# Altium schematic symbol library IC_ADI.SCHLIB: 3169 symbols (part 3 of 181) (continued)
## AD745KR-16
designator U?
Single Channel Ultralow Noise Performance Operational Amplifier, 20 MHz BW, 12.5 V/us SR, Commercial, 16-pin SOIC (RW-16), Tube; Generic Part Number: AD745; PartNumber: AD745KR-16; Amplifiers Per Package: 1; Input Bias Current: 150pA; Input Offset Voltage: 100uV; Iq/Amp: 10mA; Small Signal Bandwidth: 20MHz; V Span Max: 36V; V Span Min: 9.6V; DatasheetVersion: Rev. D; PackageVersion: 032707-B; PackageReference: RW-16; PackageDescription: 16-Pin Standard Small Outline Package, Body 10.3 x 7.5 mm, Pitch 1.27 mm; Supplier Part Number 1: AD745KR-16-ND; Packing: Tube; Slew Rate: 12.5V/us; Mounting Technology: Surface Mount; Code_JEDEC: MS-013-AA; ComponentLink1Description: Manufacturer URL; ComponentLink2Description: Datasheet; ComponentLink3Description: Package Specification
footprint SOIC16W_1.27 (Footprint not found)
part A pins: 2 OFFSET NULL (in), 3 -IN (in), 5 +IN (in), 6 -VS (power), 11 OFFSET NULL (in), 12 OUT (out), 13 +VS (power)
part B pins: 1 NC, 4 NC, 7 NC, 8 NC, 9 NC, 10 NC, 14 NC, 15 NC, 16 NC

## AD746AQ
designator U?
Double Channel Operational Amplifier, 13 MHz BW, 75 V/us SR, Industrial, 8-pin DIP (Q-8), Tube; Generic Part Number: AD746; PartNumber: AD746AQ; Amplifiers Per Package: 2; Input Bias Current: 110pA; Input Offset Voltage: 300uV; Iq/Amp: 4mA; Slew Rate: 75V/us; Small Signal Bandwidth: 13MHz; V Span Max: 36V; V Span Min: 9.6V; DatasheetVersion: Rev. B; PackageReference: Q-8; PackageDescription: 8-Pin Ceramic Dual In-Line Package, Row spacing 7.62 mm, Pitch 2.54 mm; Supplier Part Number 1: AD746AQ-ND; Supplier Part Number 2: 66F4829; Packing: Tube; Mounting Technology: Through Hole; ComponentLink1Description: Manufacturer URL; ComponentLink2Description: Datasheet; ComponentLink3Description: Package Specification
footprint DIP8 (Footprint not found)
pins on every part: 4 -V (power), 8 +V (power)
part A pins: 1 OUT (out), 2 -IN (in), 3 +IN (in)
part B pins: 5 +IN (in), 6 -IN (in), 7 OUT (out)

## AD746BQ
designator U?
Double Channel Operational Amplifier, 13 MHz BW, 75 V/us SR, Industrial, 8-pin DIP (Q-8), Tube; Generic Part Number: AD746; PartNumber: AD746BQ; Amplifiers Per Package: 2; Input Bias Current: 110pA; Input Offset Voltage: 300uV; Iq/Amp: 4mA; Slew Rate: 75V/us; Small Signal Bandwidth: 13MHz; V Span Max: 36V; V Span Min: 9.6V; DatasheetVersion: Rev. B; PackageReference: Q-8; PackageDescription: 8-Pin Ceramic Dual In-Line Package, Row spacing 7.62 mm, Pitch 2.54 mm; Supplier Part Number 1: AD746BQ-ND; Packing: Tube; Mounting Technology: Through Hole; ComponentLink1Description: Manufacturer URL; ComponentLink2Description: Datasheet; ComponentLink3Description: Package Specification
footprint DIP8 (Footprint not found)
pins on every part: 4 -V (power), 8 +V (power)
part A pins: 1 OUT (out), 2 -IN (in), 3 +IN (in)
part B pins: 5 +IN (in), 6 -IN (in), 7 OUT (out)

## AD746JN
designator U?
Double Channel Operational Amplifier, 13 MHz BW, 75 V/us SR, Commercial, 8-pin DIP (N-8), Tube; Generic Part Number: AD746; PartNumber: AD746JN; Amplifiers Per Package: 2; Input Bias Current: 110pA; Input Offset Voltage: 300uV; Iq/Amp: 4mA; Slew Rate: 75V/us; Small Signal Bandwidth: 13MHz; V Span Max: 36V; V Span Min: 9.6V; DatasheetVersion: Rev. B; PackageVersion: 070606-A; PackageReference: N-8; PackageDescription: 8-Pin Plastic Dual In-Line Package, Row spacing 7.62 mm, Pitch 2.54 mm; Supplier Part Number 1: AD746JN-ND; Packing: Tube; Mounting Technology: Through Hole; Code_JEDEC: MS-001; ComponentLink1Description: Manufacturer URL; ComponentLink2Description: Datasheet; ComponentLink3Description: Package Specification
footprint DIP8 (Footprint not found)
pins on every part: 4 -V (power), 8 +V (power)
part A pins: 1 OUT (out), 2 -IN (in), 3 +IN (in)
part B pins: 5 +IN (in), 6 -IN (in), 7 OUT (out)

## AD746SQ
designator U?
Double Channel Operational Amplifier, 13 MHz BW, 75 V/us SR, Military, 8-pin DIP (Q-8), Tube; Generic Part Number: AD746; PartNumber: AD746SQ; Amplifiers Per Package: 2; Input Bias Current: 110pA; Input Offset Voltage: 300uV; Iq/Amp: 4mA; Slew Rate: 75V/us; Small Signal Bandwidth: 13MHz; V Span Max: 36V; V Span Min: 9.6V; DatasheetVersion: Rev. B; PackageReference: Q-8; PackageDescription: 8-Pin Ceramic Dual In-Line Package, Row spacing 7.62 mm, Pitch 2.54 mm; Supplier Part Number 1: AD746SQ-ND; Supplier Part Number 2: 66F4831; Packing: Tube; Mounting Technology: Through Hole; ComponentLink1Description: Manufacturer URL; ComponentLink2Description: Datasheet; ComponentLink3Description: Package Specification
footprint DIP8 (Footprint not found)
pins on every part: 4 -V (power), 8 +V (power)
part A pins: 1 OUT (out), 2 -IN (in), 3 +IN (in)
part B pins: 5 +IN (in), 6 -IN (in), 7 OUT (out)

## AD746SQ/883B
designator U?
Double Channel Operational Amplifier, 13 MHz BW, 75 V/us SR, Military, 8-pin DIP (Q-8), Tube; Generic Part Number: AD746; PartNumber: AD746SQ/883B; Amplifiers Per Package: 2; Input Bias Current: 110pA; Input Offset Voltage: 300uV; Iq/Amp: 4mA; Slew Rate: 75V/us; Small Signal Bandwidth: 13MHz; V Span Max: 36V; V Span Min: 9.6V; DatasheetVersion: Rev. B; PackageReference: Q-8; PackageDescription: 8-Pin Ceramic Dual In-Line Package, Row spacing 7.62 mm, Pitch 2.54 mm; Supplier Part Number 1: AD746SQ/883B-ND; Packing: Tube; Mounting Technology: Through Hole; ComponentLink1Description: Manufacturer URL; ComponentLink2Description: Datasheet; ComponentLink3Description: Package Specification
footprint DIP8 (Footprint not found)
pins on every part: 4 -V (power), 8 +V (power)
part A pins: 1 OUT (out), 2 -IN (in), 3 +IN (in)
part B pins: 5 +IN (in), 6 -IN (in), 7 OUT (out)

## AD760AQ
designator U?
Single 18-Bit Self-Calibrating DACPORT, -40 to +85 degC, Q-28-2, Tube; Generic Part Number: AD760; PartNumber: AD760AQ; # DAC Outputs: 1; Max V+: 15.75V; Op Pwr Diss: 725mW; Resolution (Bits): 18; Settling Time: 6祍; Single Supply: No; DatasheetVersion: Rev.A; PackageVersion: 030106-A; PackageReference: Q-28-2; PackageDescription: 28-Lead Ceramic Dual In-Line Package [CERDIP]; Supplier Part Number 1: AD760AQ-ND; Supplier Part Number 2: 91F2883; Supplier Part Number 3: 584-AD760AQ; Packing: Tube; RoHS: N; Mounting Technology: Through Hole; ComponentLink1Description: Manufacturer URL; ComponentLink2Description: Datasheet; ComponentLink3Description: Package Specification; ComponentLink4Description: Product URL
footprint DIP28W (Footprint not found)
pins: 1 CALOK (out), 2 ~{CAL} (in), 3 -VEE (power), 4 +VCC (power), 5 +VLL (power), 6 DGND (power), 7 DB7|15 (in), 8 DB6|14 (in), 9 DB5|13 (in), 10 DB4|12 (in), 11 DB3|11 (in), 12 DB2|10|18/~{16} SERIAL (in), 13 DB1|9| MSB/~{LSB} (in), 14 DB0|8| SIN (in), 15 SOUT (out), 16 ~{CS} (in), 17 ~{LBE}| ~{UNI}/BIP CLR (in), 18 ~{HBE} (in), 19 ~{SER} (in), 20 ~{CLR} (in), 21 LDAC (in), 22 AGND (power), 23 VOUT (out), 24 SPAN/BIP OFF (in), 25 REF IN (in), 26 REF OUT (out), 27 MUXOUT (out), 28 MUXIN (in)

## AD766AN
designator U?
Single 16-Bit DSP DACPORT, -40 to +85 degC, N-16, Tube; Generic Part Number: AD766; PartNumber: AD766AN; # DAC Outputs: 1; Max V+: 13.2V; Op Pwr Diss: 150mW; Resolution (Bits): 16; Settling Time: 1.5祍; Single Supply: No; DatasheetVersion: Rev.A; PackageVersion: 070706-A; PackageReference: N-16; PackageDescription: 16-Lead Plastic Dual In-Line Package [PDIP] Narrow Body; Supplier Part Number 1: AD766AN-ND; Supplier Part Number 2: 92F8946; Supplier Part Number 3: 584-AD766AN; Packing: Tube; RoHS: N; Mounting Technology: Through Hole; Code_JEDEC: MS-001; ComponentLink1Description: Manufacturer URL; ComponentLink2Description: Datasheet; ComponentLink3Description: Package Specification; ComponentLink4Description: Product URL
footprint DIP16 (Footprint not found)
pins: 1 -VS (power) "Analog Negative Power Supply", 2 DGND (power) "Digital Ground", 3 VL (power) "Logic Positive Power Supply", 4 NC "No Connection", 5 ~{CLK} (in) "Clock Input", 6 LE (in) "Latch Enable Input", 7 DATA (in) "Serial Data Input", 8 -VL (power) "Logic Negative Power Supply", 9 VOUT (out) "Voltage Output", 10 RF (in) "Feedback Resistor", 11 SJ (in) "Summing Junction", 12 AGND (power) "Analog Ground", 13 IOUT (out) "Current Output", 14 MSB ADJ (in) "MSB Adjustment Terminal", 15 TRIM "MSB Trimming Potentiometer Terminal", 16 VS (power) "Analog Positive Power Supply"

## AD766SD/883B
designator U?
Single 16-Bit DSP DACPORT, -55 to +125 degC, D-16, Tube; Generic Part Number: AD766; PartNumber: AD766SD/883B; # DAC Outputs: 1; Max V+: 13.2V; Op Pwr Diss: 150mW; Resolution (Bits): 16; Settling Time: 1.5祍; Single Supply: No; DatasheetVersion: Rev.A; PackageVersion: Oct-2004; PackageReference: D-16; PackageDescription: 16-Lead Side-Brazed Ceramic Dual In-Line Package [SBDIP]; Supplier Part Number 1: 584-AD766SD883B; Packing: Tube; RoHS: N; Mounting Technology: Through Hole; ComponentLink1Description: Manufacturer URL; ComponentLink2Description: Datasheet; ComponentLink3Description: Package Specification; ComponentLink4Description: Product URL
footprint DIP16 (Footprint not found)
pins: 1 -VS (power) "Analog Negative Power Supply", 2 DGND (power) "Digital Ground", 3 VL (power) "Logic Positive Power Supply", 4 NC "No Connection", 5 ~{CLK} (in) "Clock Input", 6 LE (in) "Latch Enable Input", 7 DATA (in) "Serial Data Input", 8 -VL (power) "Logic Negative Power Supply", 9 VOUT (out) "Voltage Output", 10 RF (in) "Feedback Resistor", 11 SJ (in) "Summing Junction", 12 AGND (power) "Analog Ground", 13 IOUT (out) "Current Output", 14 MSB ADJ (in) "MSB Adjustment Terminal", 15 TRIM "MSB Trimming Potentiometer Terminal", 16 VS (power) "Analog Positive Power Supply"

## AD768AR
designator U?
Single 16-Bit Digital-to-Analog Converter, -40 to +85 degC, RW-28, Tube; Generic Part Number: AD768; PartNumber: AD768AR; # DAC Outputs: 1; Max V+: 5.25V; Op Pwr Diss: 600mW; Resolution (Bits): 16; Settling Time: 25ns; Single Supply: No; DatasheetVersion: Rev.B; PackageVersion: 060706-A; PackageReference: RW-28; PackageDescription: 28-Lead Standard Small Outline Package [SOIC_W]; Supplier Part Number 1: AD768AR-ND; Supplier Part Number 2: 584-AD768AR; Packing: Tube; RoHS: N; Mounting Technology: Surface Mount; Code_JEDEC: MS-013-AE; ComponentLink1Description: Manufacturer URL; ComponentLink2Description: Datasheet; ComponentLink3Description: Product URL
footprint SOIC28W_1.27 (Footprint not found)
pins: 1 IOUTA (out) "DAC Current Output. Full-scale current when all data bits are 1s.", 2 NR "Noise Reduction Node. Add capacitor for noise reduction.", 3 REFOUT (out) "Reference Output Voltage. Nominal value is 2.5 V.", 4 NC "No Connect. Reserved for internal use.", 5 REFCOM (power) "Reference Ground.", 6 IREFIN (in) "Reference Input Current. Nominal is 5 mA. DAC full-scale is 4x this current.", 7 DB0 (in) "Data Bit 0 (LSB).", 8 DB1 (in) "Data Bit 1", 9 DB2 (in) "Data Bit 2", 10 DB3 (in) "Data Bit 3", 11 DB4 (in) "Data Bit 4", 12 DB5 (in) "Data Bit 5", 13 DB6 (in) "Data Bit 6", 14 DB7 (in) "Data Bit 7", 15 DCOM (power) "Digital Ground.", 16 CLOCK (in) "Clock Input. Data latched on positive edge of clock.", 17 DB8 (in) "Data Bit 8", 18 DB9 (in) "Data Bit 9", 19 DB10 (in) "Data Bit 10", 20 DB11 (in) "Data Bit 11", 21 DB12 (in) "Data Bit 12", 22 DB13 (in) "Data Bit 13", 23 DB14 (in) "Data Bit 14", 24 DB15 (in) "Data Bit 15 (MSB).", 25 VDD (power) "Positive Supply Voltage. Nominal is +5 V.", 26 VEE (power) "Negative Supply Voltage. Nominal is -5 V.", 27 IOUTB "Complementary DAC Current Output. Full-scale current when all data bits are 0s.", 28 LADCOM (power) "DAC Ladder Common."

## AD780AN
designator U?
High Precision Reference, 2.5 or 3 V Output, 4 to 36 V Supply, Industrial, 8-pin DIP (N-8), Tube; PartNumber: AD780AN; Max V Supply (V): 36; Min V Supply (V): 4; Ref Out TC (ppm/C): 7; Vout: 2.5V, 3V; DatasheetVersion: Rev. F; PackageVersion: 070606-A, 07/2006; PackageReference: N-8; PackageDescription: 8-Pin Plastic Dual In-Line Package, Row spacing 7.62 mm, Pitch 2.54 mm; Supplier Part Number 1: AD780AN-ND; Supplier Part Number 2: N/A; Packing: Tube; Operating Temp Range: -40 to 85 degC; Mounting Technology: Through Hole; Code_JEDEC: MS-001; ComponentLink1Description: Manufacturer URL; ComponentLink2Description: Datasheet; ComponentLink3Description: Package Specification; ComponentLink4Description: URL Link1
footprint DIP8 (Footprint not found)
pins: 1 NC, 2 +VIN (power), 3 TEMP (out), 4 GND (power), 5 TRIM (in), 6 VOUT (power), 7 NC, 8 2.5V/3.0V O/P SELECT (in)

## AD780AR
designator U?
High Precision Reference, 2.5 or 3 V Output, 4 to 36 V Supply, Industrial, 8-pin SOIC (R-8), Tube; PartNumber: AD780AR; Max V Supply (V): 36; Min V Supply (V): 4; Ref Out TC (ppm/C): 7; Vout: 2.5V, 3V; DatasheetVersion: Rev. F; PackageVersion: 060506-A, 06/2006; PackageReference: R-8; PackageDescription: 8-Pin Standard Small Outline Package, Body 4.9 x 3.9 mm, Pitch 1.27 mm; Supplier Part Number 1: AD780AR-ND; Supplier Part Number 2: 584-AD780AR; Packing: Tube; Operating Temp Range: -40 to 85 degC; Mounting Technology: Surface Mount; Code_JEDEC: MS-012-AA; ComponentLink1Description: Manufacturer URL; ComponentLink2Description: Datasheet; ComponentLink3Description: Package Specification; ComponentLink4Description: URL Link1
footprint SOIC8_1.27 (Footprint not found)
pins: 1 NC, 2 +VIN (power), 3 TEMP (out), 4 GND (power), 5 TRIM (in), 6 VOUT (power), 7 NC, 8 2.5V/3.0V O/P SELECT (in)

## AD780BN
designator U?
High Precision Reference, 2.5 or 3 V Output, 4 to 36 V Supply, Industrial, 8-pin DIP (N-8), Tube; PartNumber: AD780BN; Max V Supply (V): 36; Min V Supply (V): 4; Ref Out TC (ppm/C): 3; Vout: 2.5V, 3V; DatasheetVersion: Rev. F; PackageVersion: 070606-A, 07/2006; PackageReference: N-8; PackageDescription: 8-Pin Plastic Dual In-Line Package, Row spacing 7.62 mm, Pitch 2.54 mm; Supplier Part Number 1: AD780BN-ND; Supplier Part Number 2: N/A; Packing: Tube; Operating Temp Range: -40 to 85 degC; Mounting Technology: Through Hole; Code_JEDEC: MS-001; ComponentLink1Description: Manufacturer URL; ComponentLink2Description: Datasheet; ComponentLink3Description: Package Specification; ComponentLink4Description: URL Link1
footprint DIP8 (Footprint not found)
pins: 1 NC, 2 +VIN (power), 3 TEMP (out), 4 GND (power), 5 TRIM (in), 6 VOUT (power), 7 NC, 8 2.5V/3.0V O/P SELECT (in)

## AD780BR
designator U?
High Precision Reference, 2.5 or 3 V Output, 4 to 36 V Supply, Industrial, 8-pin SOIC (R-8), Tube; PartNumber: AD780BR; Max V Supply (V): 36; Min V Supply (V): 4; Ref Out TC (ppm/C): 3; Vout: 2.5V, 3V; DatasheetVersion: Rev. F; PackageVersion: 060506-A, 06/2006; PackageReference: R-8; PackageDescription: 8-Pin Standard Small Outline Package, Body 4.9 x 3.9 mm, Pitch 1.27 mm; Supplier Part Number 1: AD780BR-ND; Supplier Part Number 2: 584-AD780BR; Packing: Tube; Operating Temp Range: -40 to 85 degC; Mounting Technology: Surface Mount; Code_JEDEC: MS-012-AA; ComponentLink1Description: Manufacturer URL; ComponentLink2Description: Datasheet; ComponentLink3Description: Package Specification; ComponentLink4Description: URL Link1
footprint SOIC8_1.27 (Footprint not found)
pins: 1 NC, 2 +VIN (power), 3 TEMP (out), 4 GND (power), 5 TRIM (in), 6 VOUT (power), 7 NC, 8 2.5V/3.0V O/P SELECT (in)

## AD790AQ
designator U?
Fast, Precision Comparator, + / - 15 V, 45 ns Delay, Industrial, 8-pin DIP (Q-8), Tube; PartNumber: AD790AQ; Input Range (V): -VS to VS-2; Total Power (mW): 250mW; Voltage Supply (V): +/-15, 5; DatasheetVersion: Rev. D; PackageVersion: Aug-05; PackageReference: Q-8; PackageDescription: 8-Pin Ceramic Dual In-Line Package, Row spacing 7.62 mm, Pitch 2.54 mm; Supplier Part Number 1: AD790AQ-ND; Supplier Part Number 2: 584-AD790AQ; Packing: Tube; Mounting Technology: Through Hole; ComponentLink1Description: Manufacturer URL; ComponentLink2Description: Datasheet; ComponentLink3Description: Package Specification; ComponentLink4Description: URL Link1; ComponentLink5Description: URL Link2
footprint DIP8 (Footprint not found)
pins: 1 +VS (power), 2 +IN (in), 3 -IN (in), 4 -VS (power), 5 ~{LATCH} (in), 6 GROUND (power), 7 OUTPUT (out), 8 VLOGIC (power)

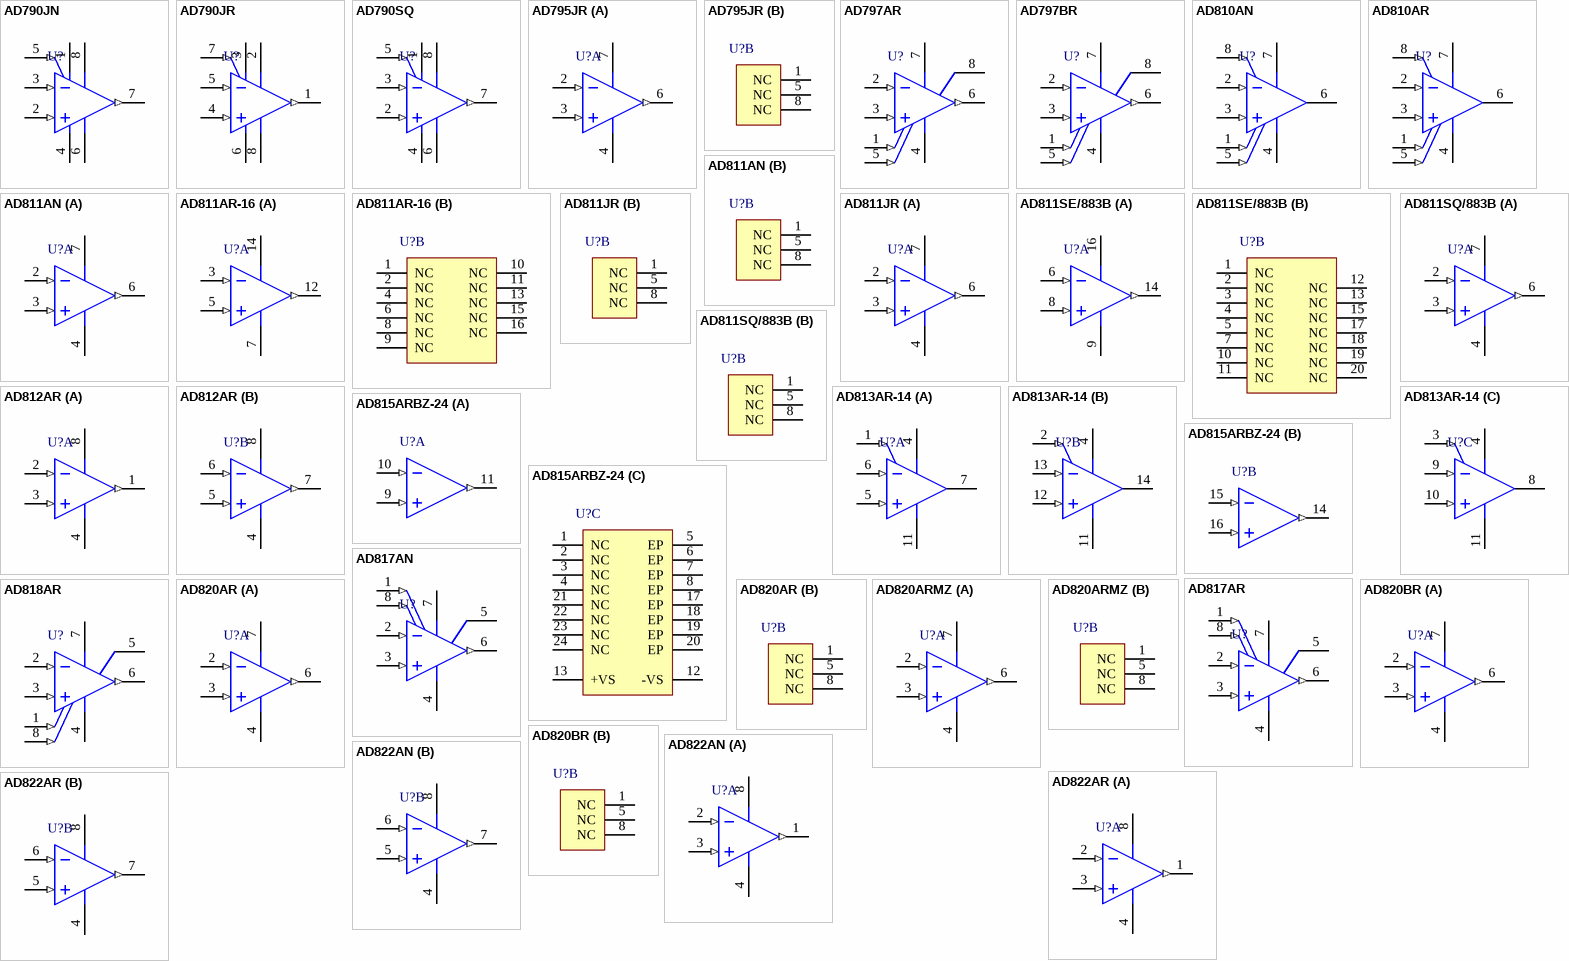
[diagram p6: symbols AD790JN to AD822AR]

## AD790JN
designator U?
Fast, Precision Comparator, + / - 15 V, 45 ns Delay, Commercial, 8-pin DIP (N-8), Tube; PartNumber: AD790JN; Input Range (V): -VS to VS-2; Total Power (mW): 250mW; Voltage Supply (V): +/-15, 5; DatasheetVersion: Rev. D; PackageVersion: 070606-A, 07/2006; PackageReference: N-8; PackageDescription: 8-Pin Plastic Dual In-Line Package, Row spacing 7.62 mm, Pitch 2.54 mm; Supplier Part Number 1: AD790JN-ND; Supplier Part Number 2: 584-AD790JN; Packing: Tube; Mounting Technology: Through Hole; Code_JEDEC: MS-001; ComponentLink1Description: Manufacturer URL; ComponentLink2Description: Datasheet; ComponentLink3Description: Package Specification; ComponentLink4Description: URL Link1; ComponentLink5Description: URL Link2
footprint DIP8 (Footprint not found)
pins: 1 +VS (power), 2 +IN (in), 3 -IN (in), 4 -VS (power), 5 ~{LATCH} (in), 6 GROUND (power), 7 OUTPUT (out), 8 VLOGIC (power)

## AD790JR
designator U?
Fast, Precision Comparator, + / - 15 V, 45 ns Delay, Commercial, 8-pin SOIC (R-8), Tube; PartNumber: AD790JR; Input Range (V): -VS to VS-2; Total Power (mW): 250mW; Voltage Supply (V): +/-15, 5; DatasheetVersion: Rev. D; PackageVersion: 060506-A, 06/2006; PackageReference: R-8; PackageDescription: 8-Pin Standard Small Outline Package, Body 4.9 x 3.9 mm, Pitch 1.27 mm; Supplier Part Number 1: AD790JR-ND; Supplier Part Number 2: 584-AD790JR; Packing: Tube; Mounting Technology: Surface Mount; Code_JEDEC: MS-012-AA; ComponentLink1Description: Manufacturer URL; ComponentLink2Description: Datasheet; ComponentLink3Description: Package Specification; ComponentLink4Description: URL Link1; ComponentLink5Description: URL Link2
footprint SOIC8_1.27 (Footprint not found)
pins: 1 OUTPUT (out), 2 VLOGIC (power), 3 +VS (power), 4 +IN (in), 5 -IN (in), 6 -VS (power), 7 ~{LATCH} (in), 8 GROUND (power)

## AD790SQ
designator U?
Fast, Precision Comparator, + / - 15 V, 45 ns Delay, Military, 8-pin DIP (Q-8), Tube; PartNumber: AD790SQ; Input Range (V): -VS to VS-2; Total Power (mW): 250mW; Voltage Supply (V): +/-15, 5; DatasheetVersion: Rev. D; PackageVersion: Aug-05; PackageReference: Q-8; PackageDescription: 8-Pin Ceramic Dual In-Line Package, Row spacing 7.62 mm, Pitch 2.54 mm; Supplier Part Number 1: AD790SQ-ND; Supplier Part Number 2: 584-AD790SQ; Packing: Tube; Mounting Technology: Through Hole; ComponentLink1Description: Manufacturer URL; ComponentLink2Description: Datasheet; ComponentLink3Description: Package Specification; ComponentLink4Description: URL Link1; ComponentLink5Description: URL Link2
footprint DIP8 (Footprint not found)
pins: 1 +VS (power), 2 +IN (in), 3 -IN (in), 4 -VS (power), 5 ~{LATCH} (in), 6 GROUND (power), 7 OUTPUT (out), 8 VLOGIC (power)

## AD795JR
designator U?
Single Channel Low Power Replacement for Burr-Brown Operational Amplifier, 16 KHz BW, 1 V/祍 SR, Commercial, 8-pin SOIC (R-8), Tube; Generic Part Number: AD795; PartNumber: AD795JR; Amplifiers Per Package: 1; Input Bias Current: 1pA; Input Offset Voltage: 100uV; Iq/Amp: 1.5mA; Slew Rate: 1V/us; Small Signal Bandwidth: 1.6MHz; V Span Max: 36V; V Span Min: 8V; DatasheetVersion: Rev. C; PackageVersion: 060506-A; PackageReference: R-8; PackageDescription: 8-Pin Standard Small Outline Package, Body 3.9 x 4.9 mm, Pitch 1.27 mm; Supplier Part Number 1: AD795JR-ND; Mounting Technology: Surface Mount; Code_JEDEC: MS-012-AA; ComponentLink1Description: Manufacturer URL; ComponentLink2Description: Datasheet; ComponentLink3Description: Package Specification
footprint SOIC8_1.27 (Footprint not found)
part A pins: 2 -IN (in), 3 +IN (in), 4 -VS (power), 6 OUT (out), 7 +VS (power)
part B pins: 1 NC, 5 NC, 8 NC

## AD797AR
designator U?
Single Channel Low Noise Operational Amplifier, 8 MHz BW, 20 V/us SR, Industrial, 8-pin SOIC (R-8), Tube; Generic Part Number: AD797; PartNumber: AD797AR; Amplifiers Per Package: 1; Input Bias Current: 250nA; Input Offset Voltage: 25uV; Iq/Amp: 10.5mA; Slew Rate: 20V/us; Small Signal Bandwidth: 8MHz; V Span Max: 36V; V Span Min: 10V; DatasheetVersion: Rev. H; PackageVersion: 060506-A; PackageReference: R-8; PackageDescription: 8-Pin Standard Small Outline Package, Body 3.9 x 4.9 mm, Pitch 1.27 mm; Supplier Part Number 1: AD797AR-ND; Mounting Technology: Surface Mount; Code_JEDEC: MS-012-AA; ComponentLink1Description: Manufacturer URL; ComponentLink2Description: Datasheet; ComponentLink3Description: Package Specification
footprint SOIC8_1.27 (Footprint not found)
pins: 1 OFFSET NULL (in), 2 -IN (in), 3 +IN (in), 4 -VS (power), 5 OFFSET NULL (in), 6 OUT (out), 7 +VS (power), 8 DECOMPENSATION AND DISTORTION NEUTRALIZATION

## AD797BR
designator U?
Single Channel Low Noise Operational Amplifier, 8 MHz BW, 20 V/us SR, Industrial, 8-pin SOIC (R-8), Tube; Generic Part Number: AD797; PartNumber: AD797BR; Amplifiers Per Package: 1; Input Bias Current: 250nA; Input Offset Voltage: 25uV; Iq/Amp: 10.5mA; Slew Rate: 20V/us; Small Signal Bandwidth: 8MHz; V Span Max: 36V; V Span Min: 10V; DatasheetVersion: Rev. H; PackageVersion: 060506-A; PackageReference: R-8; PackageDescription: 8-Pin Standard Small Outline Package, Body 3.9 x 4.9 mm, Pitch 1.27 mm; Supplier Part Number 1: AD797BR-ND; Mounting Technology: Surface Mount; Code_JEDEC: MS-012-AA; ComponentLink1Description: Manufacturer URL; ComponentLink2Description: Datasheet; ComponentLink3Description: Package Specification
footprint SOIC8_1.27 (Footprint not found)
pins: 1 OFFSET NULL (in), 2 -IN (in), 3 +IN (in), 4 -VS (power), 5 OFFSET NULL (in), 6 OUT (out), 7 +VS (power), 8 DECOMPENSATION AND DISTORTION NEUTRALIZATION

## AD810AN
designator U?
Single Channel Low Power Operational Amplifier, 80 MHz BW, 1 KV/us SR, Industrial, 8-pin DIP (N-8), Tube; Generic Part Number: AD810; PartNumber: AD810AN; Amplifiers Per Package: 1; Input Bias Current: 2uA; Input Offset Voltage: 1.5mV; Iq/Amp: 8mA; Slew Rate: 1KV/us; Small Signal Bandwidth: 80MHz; V Span Max: 36V; V Span Min: 5V; DatasheetVersion: Rev. A; PackageVersion: 070606-A; PackageReference: N-8; PackageDescription: 8-Pin Plastic Dual In-Line Package, Row spacing 7.62 mm, Pitch 2.54 mm; Supplier Part Number 1: AD810AN-ND; Mounting Technology: Through Hole; Code_JEDEC: MS-001; ComponentLink1Description: Manufacturer URL; ComponentLink2Description: Datasheet; ComponentLink3Description: Package Specification
footprint DIP8 (Footprint not found)
pins: 1 OFFSET NULL (in), 2 -IN (in), 3 +IN (in), 4 -VS (power), 5 OFFSET NULL (in), 6 OUT (hiz), 7 +VS (power), 8 ~{DISABLE} (in)

## AD810AR
designator U?
Single Channel Low Power Operational Amplifier, 80 MHz BW, 1 KV/us SR, Industrial, 8-pin SOIC (R-8), Tube; Generic Part Number: AD810; PartNumber: AD810AR; Amplifiers Per Package: 1; Input Bias Current: 2uA; Input Offset Voltage: 1.5mV; Iq/Amp: 8mA; Slew Rate: 1KV/us; Small Signal Bandwidth: 80MHz; V Span Max: 36V; V Span Min: 5V; DatasheetVersion: Rev. A; PackageVersion: 060506-A; PackageReference: R-8; PackageDescription: 8-Pin Standard Small Outline Package, Body 3.9 x 4.9 mm, Pitch 1.27 mm; Supplier Part Number 1: AD810AR-ND; Mounting Technology: Surface Mount; Code_JEDEC: MS-012-AA; ComponentLink1Description: Manufacturer URL; ComponentLink2Description: Datasheet; ComponentLink3Description: Package Specification
footprint SOIC8_1.27 (Footprint not found)
pins: 1 OFFSET NULL (in), 2 -IN (in), 3 +IN (in), 4 -VS (power), 5 OFFSET NULL (in), 6 OUT (hiz), 7 +VS (power), 8 ~{DISABLE} (in)

## AD811AN
designator U?
Single Channel Low Distortion Operational Amplifier, 140 MHz BW, 2.5 KV/us SR, Industrial, 8-pin DIP (N-8), Tube; Generic Part Number: AD811; PartNumber: AD811AN; Amplifiers Per Package: 1; Input Bias Current: 2uA; Input Offset Voltage: 500uV; Iq/Amp: 16mA; Small Signal Bandwidth: 140MHz; V Span Max: 36V; V Span Min: 9V; DatasheetVersion: Rev. E; PackageVersion: 070606-A; PackageReference: N-8; PackageDescription: 8-Pin Plastic Dual In-Line Package, Row spacing 7.62 mm, Pitch 2.54 mm; Supplier Part Number 1: AD811AN-ND; Slew Rate: 2.5KV/us; Mounting Technology: Through Hole; Code_JEDEC: MS-001; ComponentLink1Description: Manufacturer URL; ComponentLink2Description: Datasheet; ComponentLink3Description: Package Specification
footprint DIP8 (Footprint not found)
part A pins: 2 -IN (in), 3 +IN (in), 4 -VS (power), 6 OUT (out), 7 +VS (power)
part B pins: 1 NC, 5 NC, 8 NC

## AD811AR-16
designator U?
Single Channel Low Distortion Operational Amplifier, 140 MHz BW, 2.5 KV/us SR, Industrial, 16-pin SOIC (RW-16), Tube; Generic Part Number: AD811; PartNumber: AD811AR-16; Amplifiers Per Package: 1; Input Bias Current: 2uA; Input Offset Voltage: 500uV; Iq/Amp: 16mA; Small Signal Bandwidth: 140MHz; V Span Max: 36V; V Span Min: 9V; DatasheetVersion: Rev. E; PackageVersion: 032707-B; PackageReference: RW-16; PackageDescription: 16-Pin Standard Small Outline Package, Body 10.3 x 7.5 mm, Pitch 1.27 mm; Supplier Part Number 1: AD811AR-16-ND; Slew Rate: 2.5KV/us; Mounting Technology: Surface Mount; Code_JEDEC: MS-013-AA; ComponentLink1Description: Manufacturer URL; ComponentLink2Description: Datasheet; ComponentLink3Description: Package Specification
footprint SOIC16W_1.27 (Footprint not found)
part A pins: 3 -IN (in), 5 +IN (in), 7 -VS (power), 12 OUT (out), 14 +VS (power)
part B pins: 1 NC, 2 NC, 4 NC, 6 NC, 8 NC, 9 NC, 10 NC, 11 NC, 13 NC, 15 NC, 16 NC

## AD811JR
designator U?
Single Channel Low Distortion Operational Amplifier, 140 MHz BW, 2.5 KV/us SR, Commercial, 8-pin SOIC (R-8), Tube; Generic Part Number: AD811; PartNumber: AD811JR; Amplifiers Per Package: 1; Input Bias Current: 2uA; Input Offset Voltage: 500uV; Iq/Amp: 16mA; Small Signal Bandwidth: 140MHz; V Span Max: 36V; V Span Min: 9V; DatasheetVersion: Rev. E; PackageVersion: 060506-A; PackageReference: R-8; PackageDescription: 8-Pin Standard Small Outline Package, Body 3.9 x 4.9 mm, Pitch 1.27 mm; Supplier Part Number 1: AD811JR-ND; Slew Rate: 2.5KV/us; Mounting Technology: Surface Mount; Code_JEDEC: MS-012-AA; ComponentLink1Description: Manufacturer URL; ComponentLink2Description: Datasheet; ComponentLink3Description: Package Specification
footprint SOIC8_1.27 (Footprint not found)
part A pins: 2 -IN (in), 3 +IN (in), 4 -VS (power), 6 OUT (out), 7 +VS (power)
part B pins: 1 NC, 5 NC, 8 NC

## AD811SE/883B
designator U?
Single Channel Low Distortion Operational Amplifier, 140 MHz BW, 2.5 KV/us SR, Military, 20-pin LCC (E-20A), Tube; Generic Part Number: AD811; PartNumber: AD811SE/883B; Amplifiers Per Package: 1; Input Bias Current: 2uA; Input Offset Voltage: 500uV; Iq/Amp: 16mA; Small Signal Bandwidth: 140MHz; V Span Max: 36V; V Span Min: 9V; DatasheetVersion: Rev. E; PackageVersion: Rev. C; PackageReference: E-20A; PackageDescription: 20-Pin Terminal Ceramic Leadless Chip Carrier, Body 8.89 x 8.89 mm, Pitch 1.27 mm; Supplier Part Number 1: AD811SE/883B-ND; Slew Rate: 2.5KV/us; Mounting Technology: Surface Mount; ComponentLink1Description: Manufacturer URL; ComponentLink2Description: Datasheet; ComponentLink3Description: Package Specification
footprint PLCC-20N (Footprint not found)
part A pins: 6 -IN (in), 8 +IN (in), 9 -VS (power), 14 OUT (out), 16 +VS (power)
part B pins: 1 NC, 2 NC, 3 NC, 4 NC, 5 NC, 7 NC, 10 NC, 11 NC, 12 NC, 13 NC, 15 NC, 17 NC, 18 NC, 19 NC, 20 NC

## AD811SQ/883B
designator U?
Single Channel Low Distortion Operational Amplifier, 140 MHz BW, 2.5 KV/us SR, Military, 8-pin DIP (Q-8), Tube; Generic Part Number: AD811; PartNumber: AD811SQ/883B; Amplifiers Per Package: 1; Input Bias Current: 2uA; Input Offset Voltage: 500uV; Iq/Amp: 16mA; Small Signal Bandwidth: 140MHz; V Span Max: 36V; V Span Min: 9V; DatasheetVersion: Rev. E; PackageReference: Q-8; PackageDescription: 8-Pin Ceramic Dual In-Line Package, Row spacing 7.62 mm, Pitch 2.54 mm; Supplier Part Number 1: AD811SQ/883B-ND; Supplier Part Number 2: 1464857; Slew Rate: 2.5KV/us; Mounting Technology: Through Hole; ComponentLink1Description: Manufacturer URL; ComponentLink2Description: Datasheet; ComponentLink3Description: Package Specification
footprint DIP8 (Footprint not found)
part A pins: 2 -IN (in), 3 +IN (in), 4 -VS (power), 6 OUT (out), 7 +VS (power)
part B pins: 1 NC, 5 NC, 8 NC

## AD812AR
designator U?
Double Channel Low Power Operational Amplifier, 145 MHz BW, 425 V/us SR, Industrial, 8-pin SOIC (R-8), Tube; Generic Part Number: AD812; PartNumber: AD812AR; Amplifiers Per Package: 2; Input Bias Current: 300nA; Input Offset Voltage: 2mV; Iq/Amp: 5.5mA; Small Signal Bandwidth: 145MHz; V Span Max: 36V; V Span Min: 2.4V; DatasheetVersion: Rev. B; PackageVersion: 060506-A; PackageReference: R-8; PackageDescription: 8-Pin Standard Small Outline Package, Body 3.9 x 4.9 mm, Pitch 1.27 mm; Supplier Part Number 1: AD812AR-ND; Slew Rate: 425V/us; Mounting Technology: Surface Mount; Code_JEDEC: MS-012-AA; ComponentLink1Description: Manufacturer URL; ComponentLink2Description: Datasheet; ComponentLink3Description: Package Specification
footprint SOIC8_1.27 (Footprint not found)
pins on every part: 4 -V (power), 8 +V (power)
part A pins: 1 OUT 1 (out), 2 -IN 1 (in), 3 +IN 1 (in)
part B pins: 5 +IN 2 (in), 6 -IN 2 (in), 7 OUT 2 (out)

## AD813AR-14
designator U?
3 Channel Low Power Operational Amplifier, 100 MHz BW, 250 V/us SR, Industrial, 14-pin SOIC (R-14), Tube; Generic Part Number: AD813; PartNumber: AD813AR-14; Amplifiers Per Package: 3; Input Bias Current: 500nA; Input Offset Voltage: 2mV; Iq/Amp: 5.5mA; Small Signal Bandwidth: 100MHz; V Span Max: 36V; V Span Min: 2.4V; DatasheetVersion: Rev. B; PackageVersion: 060606-A; PackageReference: R-14; PackageDescription: 14-Pin Standard Small Outline Package, Body 8.65 x 3.9 mm, Pitch 1.27 mm; Supplier Part Number 1: AD813AR-14-ND; Supplier Part Number 2: 05F7671; Slew Rate: 250V/us; Mounting Technology: Surface Mount; Code_JEDEC: MS-012-AB; ComponentLink1Description: Manufacturer URL; ComponentLink2Description: Datasheet; ComponentLink3Description: Package Specification
footprint SOIC14_1.27 (Footprint not found)
pins on every part: 4 VS+ (power), 11 VS- (power)
part A pins: 1 ~{DISABLE1} (in), 5 +IN 1 (in), 6 -IN 1 (in), 7 OUT 1 (hiz)
part B pins: 2 ~{DISABLE2} (in), 12 +IN 2 (in), 13 -IN 2 (in), 14 OUT 2 (hiz)
part C pins: 3 ~{DISABLE3} (in), 8 OUT 3 (hiz), 9 -IN 3 (in), 10 +IN 3 (in)

## AD815ARBZ-24
designator U?
Double Channel Low Distortion Operational Amplifier, 120 MHz BW, 900 V/us SR, Industrial, 24-pin SOIC (RB-24), Tube; Generic Part Number: AD815; PartNumber: AD815ARBZ-24; Amplifiers Per Package: 2; Input Bias Current: 2uA; Input Offset Voltage: 10mV; Iq/Amp: 40mA; Small Signal Bandwidth: 120MHz; V Span Max: 36V; V Span Min: 10V; DatasheetVersion: Rev. C; PackageReference: RB-24; PackageDescription: 24-Pin Batwing SOIC, Thermally Enhanced with Fused Leads, Body 15.4 x 7.5 mm, Pitch 1.27 mm; Slew Rate: 900V/us; Mounting Technology: Surface Mount; Code_JEDEC: MS-013-AD; ComponentLink1Description: Manufacturer URL; ComponentLink2Description: Datasheet; ComponentLink3Description: Package Specification
footprint SOIC24W_1.27 (Footprint not found)
part A pins: 9 +IN 1 (in), 10 -IN 1 (in), 11 OUT 1 (out)
part B pins: 14 OUT 2 (out), 15 -IN 2 (in), 16 +IN 2 (in)
part C pins: 1 NC "NO CONNECT", 2 NC "NO CONNECT", 3 NC "NO CONNECT", 4 NC "NO CONNECT", 5 EP (power) "HEAT TABS ARE CONNECTED TO THE POSITIVE SUPPLY.", 6 EP (power) "HEAT TABS ARE CONNECTED TO THE POSITIVE SUPPLY.", 7 EP (power) "HEAT TABS ARE CONNECTED TO THE POSITIVE SUPPLY.", 8 EP (power) "HEAT TABS ARE CONNECTED TO THE POSITIVE SUPPLY.", 12 -VS (power), 13 +VS (power), 17 EP (power) "HEAT TABS ARE CONNECTED TO THE POSITIVE SUPPLY.", 18 EP (power) "HEAT TABS ARE CONNECTED TO THE POSITIVE SUPPLY.", 19 EP (power) "HEAT TABS ARE CONNECTED TO THE POSITIVE SUPPLY.", 20 EP (power) "HEAT TABS ARE CONNECTED TO THE POSITIVE SUPPLY.", 21 NC "NO CONNECT", 22 NC "NO CONNECT", 23 NC "NO CONNECT", 24 NC "NO CONNECT"

## AD817AN
designator U?
Single Channel Low Power Operational Amplifier, 50 MHz BW, 350 V/us SR, Industrial, 8-pin DIP (N-8), Tube; Generic Part Number: AD817; PartNumber: AD817AN; Amplifiers Per Package: 1; Input Bias Current: 3.3uA; Input Offset Voltage: 500uV; Iq/Amp: 7.5mA; Small Signal Bandwidth: 50MHz; V Span Max: 36V; V Span Min: 5V; DatasheetVersion: Rev. B; PackageVersion: 070606-A; PackageReference: N-8; PackageDescription: 8-Pin Plastic Dual In-Line Package, Row spacing 7.62 mm, Pitch 2.54 mm; Supplier Part Number 1: AD817AN-ND; Slew Rate: 350V/us; Mounting Technology: Through Hole; Code_JEDEC: MS-001; ComponentLink1Description: Manufacturer URL; ComponentLink2Description: Datasheet; ComponentLink3Description: Package Specification
footprint DIP8 (Footprint not found)
pins: 1 NULL (in), 2 -IN (in), 3 +IN (in), 4 -VS (power), 5 NC, 6 OUT (out), 7 +VS (power), 8 NULL (in)

## AD817AR
designator U?
Single Channel Low Power Operational Amplifier, 50 MHz BW, 350 V/us SR, Industrial, 8-pin SOIC (R-8), Tube; Generic Part Number: AD817; PartNumber: AD817AR; Amplifiers Per Package: 1; Input Bias Current: 3.3uA; Input Offset Voltage: 500uV; Iq/Amp: 7.5mA; Small Signal Bandwidth: 50MHz; V Span Max: 36V; V Span Min: 5V; DatasheetVersion: Rev. B; PackageVersion: 060506-A; PackageReference: R-8; PackageDescription: 8-Pin Standard Small Outline Package, Body 3.9 x 4.9 mm, Pitch 1.27 mm; Supplier Part Number 1: AD817AR-ND; Slew Rate: 350V/us; Mounting Technology: Surface Mount; Code_JEDEC: MS-012-AA; ComponentLink1Description: Manufacturer URL; ComponentLink2Description: Datasheet; ComponentLink3Description: Package Specification
footprint SOIC8_1.27 (Footprint not found)
pins: 1 NULL (in), 2 -IN (in), 3 +IN (in), 4 -VS (power), 5 NC, 6 OUT (out), 7 +VS (power), 8 NULL (in)

## AD818AR
designator U?
Single Channel Low Cost Operational Amplifier, 130 MHz BW, 500 V/us SR, Industrial, 8-pin SOIC (R-8), Tube; Generic Part Number: AD818; PartNumber: AD818AR; Amplifiers Per Package: 1; Input Bias Current: 3.3uA; Input Offset Voltage: 500uV; Iq/Amp: 7.5mA; Small Signal Bandwidth: 130MHz; V Span Max: 36V; V Span Min: 5V; DatasheetVersion: Rev. D; PackageVersion: 060506-A; PackageReference: R-8; PackageDescription: 8-Pin Standard Small Outline Package, Body 3.9 x 4.9 mm, Pitch 1.27 mm; Supplier Part Number 1: AD818AR-ND; Slew Rate: 500V/us; Mounting Technology: Surface Mount; Code_JEDEC: MS-012-AA; ComponentLink1Description: Manufacturer URL; ComponentLink2Description: Datasheet; ComponentLink3Description: Package Specification
footprint SOIC8_1.27 (Footprint not found)
pins: 1 NULL (in), 2 -IN (in), 3 +IN (in), 4 -VS (power), 5 NC, 6 OUT (out), 7 +VS (power), 8 NULL (in)

## AD820AR
designator U?
Single Channel Rail-to-Rail Operational Amplifier, 1.9 MHz BW, 3 V/us SR, Industrial, 8-pin SOIC (R-8), Tube; Generic Part Number: AD820; PartNumber: AD820AR; Amplifiers Per Package: 1; Input Bias Current: 2pA; Input Offset Voltage: 100uV; Iq/Amp: 900uA; Slew Rate: 3V/us; Small Signal Bandwidth: 1.9MHz; V Span Max: 36V; V Span Min: 5V; DatasheetVersion: Rev. H; PackageVersion: 060506-A; PackageReference: R-8; PackageDescription: 8-Pin Standard Small Outline Package, Body 3.9 x 4.9 mm, Pitch 1.27 mm; Supplier Part Number 1: AD820AR-ND; Mounting Technology: Surface Mount; Code_JEDEC: MS-012-AA; ComponentLink1Description: Manufacturer URL; ComponentLink2Description: Datasheet; ComponentLink3Description: Package Specification
footprint SOIC8_1.27 (Footprint not found)
part A pins: 2 -IN (in), 3 +IN (in), 4 -VS (power), 6 VOUT (out), 7 +VS (power)
part B pins: 1 NC, 5 NC, 8 NC

## AD820ARMZ
designator U?
Single Channel Rail-to-Rail Operational Amplifier, 1.9 MHz BW, 3 V/us SR, Industrial, 8-pin SOP (RM-8), Tube; Generic Part Number: AD820; PartNumber: AD820ARMZ; Amplifiers Per Package: 1; Input Bias Current: 2pA; Input Offset Voltage: 100uV; Iq/Amp: 900uA; Slew Rate: 3V/us; Small Signal Bandwidth: 1.9MHz; V Span Max: 36V; V Span Min: 5V; DatasheetVersion: Rev. H; PackageReference: RM-8; PackageDescription: 8-Pin Mini Small Outline Package, Body 3 x 3 mm, Pitch 0.65 mm; Supplier Part Number 1: AD820ARMZ-ND; Supplier Part Number 2: 2074879; Supplier Part Number 3: 76T1827; Supplier Part Number 4: 11R1031; Mounting Technology: Surface Mount; Code_JEDEC: MO-187-AA; ComponentLink1Description: Manufacturer URL; ComponentLink2Description: Datasheet; ComponentLink3Description: Package Specification
footprint VSSOP8_0.65 (Footprint not found)
part A pins: 2 -IN (in), 3 +IN (in), 4 -VS (power), 6 VOUT (out), 7 +VS (power)
part B pins: 1 NC, 5 NC, 8 NC

## AD820BR
designator U?
Single Channel Rail-to-Rail Operational Amplifier, 1.9 MHz BW, 3 V/us SR, Industrial, 8-pin SOIC (R-8), Tube; Generic Part Number: AD820; PartNumber: AD820BR; Amplifiers Per Package: 1; Input Bias Current: 2pA; Input Offset Voltage: 100uV; Iq/Amp: 900uA; Slew Rate: 3V/us; Small Signal Bandwidth: 1.9MHz; V Span Max: 36V; V Span Min: 5V; DatasheetVersion: Rev. H; PackageVersion: 060506-A; PackageReference: R-8; PackageDescription: 8-Pin Standard Small Outline Package, Body 3.9 x 4.9 mm, Pitch 1.27 mm; Supplier Part Number 1: AD820BR-ND; Mounting Technology: Surface Mount; Code_JEDEC: MS-012-AA; ComponentLink1Description: Manufacturer URL; ComponentLink2Description: Datasheet; ComponentLink3Description: Package Specification
footprint SOIC8_1.27 (Footprint not found)
part A pins: 2 -IN (in), 3 +IN (in), 4 -VS (power), 6 VOUT (out), 7 +VS (power)
part B pins: 1 NC, 5 NC, 8 NC

## AD822AN
designator U?
Double Channel Rail-to-Rail Operational Amplifier, 1.9 MHz BW, 3 V/us SR, Industrial, 8-pin DIP (N-8), Tube; Generic Part Number: AD822; PartNumber: AD822AN; Amplifiers Per Package: 2; Input Bias Current: 2pA; Input Offset Voltage: 100uV; Iq/Amp: 900uA; Slew Rate: 3V/us; Small Signal Bandwidth: 1.9MHz; V Span Max: 30V; V Span Min: 5V; DatasheetVersion: Rev. I; PackageVersion: 070606-A; PackageReference: N-8; PackageDescription: 8-Pin Plastic Dual In-Line Package, Row spacing 7.62 mm, Pitch 2.54 mm; Supplier Part Number 1: AD822AN-ND; Mounting Technology: Through Hole; Code_JEDEC: MS-001; ComponentLink1Description: Manufacturer URL; ComponentLink2Description: Datasheet; ComponentLink3Description: Package Specification; ComponentLink4Description: Reference Circuit
footprint DIP8 (Footprint not found)
pins on every part: 4 -V (power), 8 +V (power)
part A pins: 1 OUT 1 (out), 2 -IN 1 (in), 3 +IN 1 (in)
part B pins: 5 +IN 2 (in), 6 -IN 2 (in), 7 OUT 2 (out)

## AD822AR
designator U?
Double Channel Rail-to-Rail Operational Amplifier, 1.9 MHz BW, 3 V/us SR, Industrial, 8-pin SOIC (R-8), Tube; Generic Part Number: AD822; PartNumber: AD822AR; Amplifiers Per Package: 2; Input Bias Current: 2pA; Input Offset Voltage: 100uV; Iq/Amp: 900uA; Slew Rate: 3V/us; Small Signal Bandwidth: 1.9MHz; V Span Max: 30V; V Span Min: 5V; DatasheetVersion: Rev. I; PackageVersion: 060506-A; PackageReference: R-8; PackageDescription: 8-Pin Standard Small Outline Package, Body 3.9 x 4.9 mm, Pitch 1.27 mm; Supplier Part Number 1: AD822AR-ND; Supplier Part Number 2: 2235201; Supplier Part Number 3: 05F7684; Mounting Technology: Surface Mount; Code_JEDEC: MS-012-AA; ComponentLink1Description: Manufacturer URL; ComponentLink2Description: Datasheet; ComponentLink3Description: Package Specification; ComponentLink4Description: Reference Circuit
footprint SOIC8_1.27 (Footprint not found)
pins on every part: 4 -V (power), 8 +V (power)
part A pins: 1 OUT 1 (out), 2 -IN 1 (in), 3 +IN 1 (in)
part B pins: 5 +IN 2 (in), 6 -IN 2 (in), 7 OUT 2 (out)

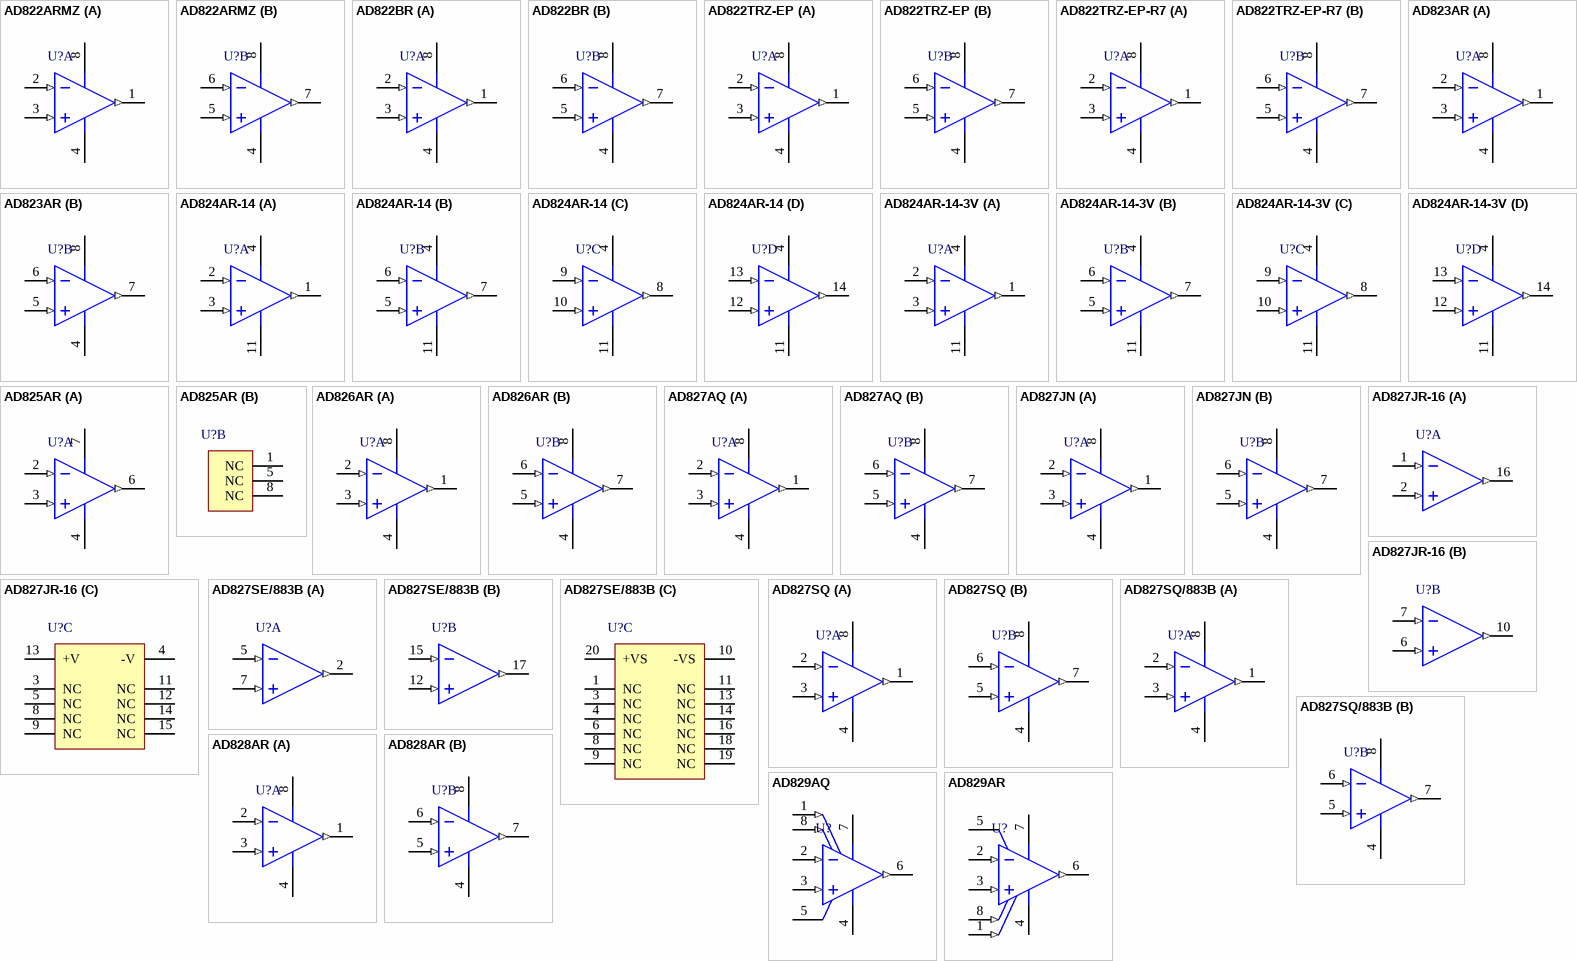
[diagram p7: symbols AD822ARMZ to AD829AR]

## AD822ARMZ
designator U?
Double Channel Rail-to-Rail Operational Amplifier, 1.9 MHz BW, 3 V/us SR, Industrial, 8-pin SOP (RM-8), Tube; Generic Part Number: AD822; PartNumber: AD822ARMZ; Amplifiers Per Package: 2; Input Bias Current: 2pA; Input Offset Voltage: 100uV; Iq/Amp: 900uA; Slew Rate: 3V/us; Small Signal Bandwidth: 1.9MHz; V Span Max: 30V; V Span Min: 5V; DatasheetVersion: Rev. I; PackageReference: RM-8; PackageDescription: 8-Pin Mini Small Outline Package, Body 3 x 3 mm, Pitch 0.65 mm; Supplier Part Number 1: AD822ARMZ-ND; Supplier Part Number 2: 2112574; Supplier Part Number 3: 19P8296; Mounting Technology: Surface Mount; Code_JEDEC: MO-187-AA; ComponentLink1Description: Manufacturer URL; ComponentLink2Description: Datasheet; ComponentLink3Description: Package Specification; ComponentLink4Description: Reference Circuit
footprint VSSOP8_0.65 (Footprint not found)
pins on every part: 4 -V (power), 8 +V (power)
part A pins: 1 OUT 1 (out), 2 -IN 1 (in), 3 +IN 1 (in)
part B pins: 5 +IN 2 (in), 6 -IN 2 (in), 7 OUT 2 (out)

## AD822BR
designator U?
Double Channel Rail-to-Rail Operational Amplifier, 1.9 MHz BW, 3 V/us SR, Industrial, 8-pin SOIC (R-8), Tube; Generic Part Number: AD822; PartNumber: AD822BR; Amplifiers Per Package: 2; Input Bias Current: 2pA; Input Offset Voltage: 100uV; Iq/Amp: 900uA; Slew Rate: 3V/us; Small Signal Bandwidth: 1.9MHz; V Span Max: 30V; V Span Min: 5V; DatasheetVersion: Rev. I; PackageVersion: 060506-A; PackageReference: R-8; PackageDescription: 8-Pin Standard Small Outline Package, Body 3.9 x 4.9 mm, Pitch 1.27 mm; Supplier Part Number 1: AD822BR-ND; Mounting Technology: Surface Mount; Code_JEDEC: MS-012-AA; ComponentLink1Description: Manufacturer URL; ComponentLink2Description: Datasheet; ComponentLink3Description: Package Specification; ComponentLink4Description: Reference Circuit
footprint SOIC8_1.27 (Footprint not found)
pins on every part: 4 -V (power), 8 +V (power)
part A pins: 1 OUT 1 (out), 2 -IN 1 (in), 3 +IN 1 (in)
part B pins: 5 +IN 2 (in), 6 -IN 2 (in), 7 OUT 2 (out)

## AD822TRZ-EP
designator U?
Double Channel Rail-to-Rail Operational Amplifier, 1.9 MHz BW, 3 V/us SR, Military, 8-pin SOIC (R-8), Tube; Generic Part Number: AD822; PartNumber: AD822TRZ-EP; Amplifiers Per Package: 2; Input Bias Current: 2pA; Input Offset Voltage: 100uV; Iq/Amp: 900uA; Slew Rate: 3V/us; Small Signal Bandwidth: 1.9MHz; V Span Max: 30V; V Span Min: 5V; DatasheetVersion: Rev. I; PackageVersion: 060506-A; PackageReference: R-8; PackageDescription: 8-Pin Standard Small Outline Package, Body 3.9 x 4.9 mm, Pitch 1.27 mm; Supplier Part Number 1: AD822TRZ-EP-ND; Supplier Part Number 2: 83R9365; Mounting Technology: Surface Mount; Code_JEDEC: MS-012-AA; ComponentLink1Description: Manufacturer URL; ComponentLink2Description: Datasheet; ComponentLink3Description: Package Specification; ComponentLink4Description: Reference Circuit
footprint SOIC8_1.27 (Footprint not found)
pins on every part: 4 -V (power), 8 +V (power)
part A pins: 1 OUT 1 (out), 2 -IN 1 (in), 3 +IN 1 (in)
part B pins: 5 +IN 2 (in), 6 -IN 2 (in), 7 OUT 2 (out)

## AD822TRZ-EP-R7
designator U?
Double Channel Rail-to-Rail Operational Amplifier, 1.9 MHz BW, 3 V/us SR, Military, 8-pin SOIC (R-8), Reel; Generic Part Number: AD822; PartNumber: AD822TRZ-EP-R7; Amplifiers Per Package: 2; Input Bias Current: 2pA; Input Offset Voltage: 100uV; Iq/Amp: 900uA; Slew Rate: 3V/us; Small Signal Bandwidth: 1.9MHz; V Span Max: 30V; V Span Min: 5V; DatasheetVersion: Rev. I; PackageVersion: 060506-A; PackageReference: R-8; PackageDescription: 8-Pin Standard Small Outline Package, Body 3.9 x 4.9 mm, Pitch 1.27 mm; Supplier Part Number 1: AD822TRZ-EP-R7TR-ND; Supplier Part Number 2: AD822TRZ-EP-R7CT-ND; Supplier Part Number 3: AD822TRZ-EP-R7DKR-ND; Supplier Part Number 4: 83R9366; Mounting Technology: Surface Mount; Code_JEDEC: MS-012-AA; ComponentLink1Description: Manufacturer URL; ComponentLink2Description: Datasheet; ComponentLink3Description: Package Specification; ComponentLink4Description: Reference Circuit
footprint SOIC8_1.27 (Footprint not found)
pins on every part: 4 -V (power), 8 +V (power)
part A pins: 1 OUT 1 (out), 2 -IN 1 (in), 3 +IN 1 (in)
part B pins: 5 +IN 2 (in), 6 -IN 2 (in), 7 OUT 2 (out)

## AD823AR
designator U?
Double Channel Rail-to-Rail Operational Amplifier, 16 MHz BW, 25 V/us SR, Industrial, 8-pin SOIC (R-8), Tube; Generic Part Number: AD823; PartNumber: AD823AR; Amplifiers Per Package: 2; Input Bias Current: 5pA; Input Offset Voltage: 700uV; Iq/Amp: 4.2mA; Slew Rate: 25V/us; Small Signal Bandwidth: 16MHz; V Span Max: 36V; V Span Min: 3V; DatasheetVersion: Rev. E; PackageVersion: 060506-A; PackageReference: R-8; PackageDescription: 8-Pin Standard Small Outline Package, Body 3.9 x 4.9 mm, Pitch 1.27 mm; Supplier Part Number 1: AD823AR-ND; Supplier Part Number 2: 66F6361; Mounting Technology: Surface Mount; Code_JEDEC: MS-012-AA; ComponentLink1Description: Manufacturer URL; ComponentLink2Description: Datasheet; ComponentLink3Description: Package Specification
footprint SOIC8_1.27 (Footprint not found)
pins on every part: 4 -VS (power), 8 +VS (power)
part A pins: 1 OUT 1 (out), 2 -IN 1 (in), 3 +IN 1 (in)
part B pins: 5 +IN 2 (in), 6 -IN 2 (in), 7 OUT 2 (out)

## AD824AR-14
designator U?
Quad Channel Rail-to-Rail Operational Amplifier, 2 MHz BW, 2 V/us SR, Industrial, 14-pin SOIC (R-14), Tube; Generic Part Number: AD824; PartNumber: AD824AR-14; Amplifiers Per Package: 4; Input Bias Current: 4pA; Input Offset Voltage: 500uV; Iq/Amp: 625uA; Slew Rate: 2V/us; Small Signal Bandwidth: 2MHz; V Span Max: 36V; V Span Min: 3V; DatasheetVersion: Rev. C; PackageVersion: 060606-A; PackageReference: R-14; PackageDescription: 14-Pin Standard Small Outline Package, Body 8.65 x 3.9 mm, Pitch 1.27 mm; Supplier Part Number 1: AD824AR-14-ND; Supplier Part Number 2: 52F2075; Mounting Technology: Surface Mount; Code_JEDEC: MS-012-AB; ComponentLink1Description: Manufacturer URL; ComponentLink2Description: Datasheet; ComponentLink3Description: Package Specification
footprint SOIC14_1.27 (Footprint not found)
pins on every part: 4 +V (power), 11 -V (power)
part A pins: 1 OUT A (out), 2 -IN A (in), 3 +IN A (in)
part B pins: 5 +IN B (in), 6 -IN B (in), 7 OUT B (out)
part C pins: 8 OUT C (out), 9 -IN C (in), 10 +IN C (in)
part D pins: 12 +IN D (in), 13 -IN D (in), 14 OUT D (out)

## AD824AR-14-3V
designator U?
Quad Channel Rail-to-Rail Operational Amplifier, 2 MHz BW, 2 V/us SR, Industrial, 14-pin SOIC (R-14), Tube; Generic Part Number: AD824; PartNumber: AD824AR-14-3V; Amplifiers Per Package: 4; Input Bias Current: 4pA; Input Offset Voltage: 500uV; Iq/Amp: 625uA; Slew Rate: 2V/us; Small Signal Bandwidth: 2MHz; V Span Max: 36V; V Span Min: 3V; DatasheetVersion: Rev. C; PackageVersion: 060606-A; PackageReference: R-14; PackageDescription: 14-Pin Standard Small Outline Package, Body 8.65 x 3.9 mm, Pitch 1.27 mm; Supplier Part Number 1: AD824AR-14-3V-ND; Mounting Technology: Surface Mount; Code_JEDEC: MS-012-AB; ComponentLink1Description: Manufacturer URL; ComponentLink2Description: Datasheet; ComponentLink3Description: Package Specification
footprint SOIC14_1.27 (Footprint not found)
pins on every part: 4 +V (power), 11 -V (power)
part A pins: 1 OUT A (out), 2 -IN A (in), 3 +IN A (in)
part B pins: 5 +IN B (in), 6 -IN B (in), 7 OUT B (out)
part C pins: 8 OUT C (out), 9 -IN C (in), 10 +IN C (in)
part D pins: 12 +IN D (in), 13 -IN D (in), 14 OUT D (out)